# Altium footprint library XU-GENARAL PCB .PcbLib: 1176 footprints (part 51 of 75)
Each footprint in its own frame and in the unit in brackets; x right, y up, seen from the top. Pads: shape width x height; smd on the part's side, far side on the other; paste and mask are expansions set on the pad; w line width, h text height; cw(c..) or ccw(c..) is an arc to the next point about the centre after c.
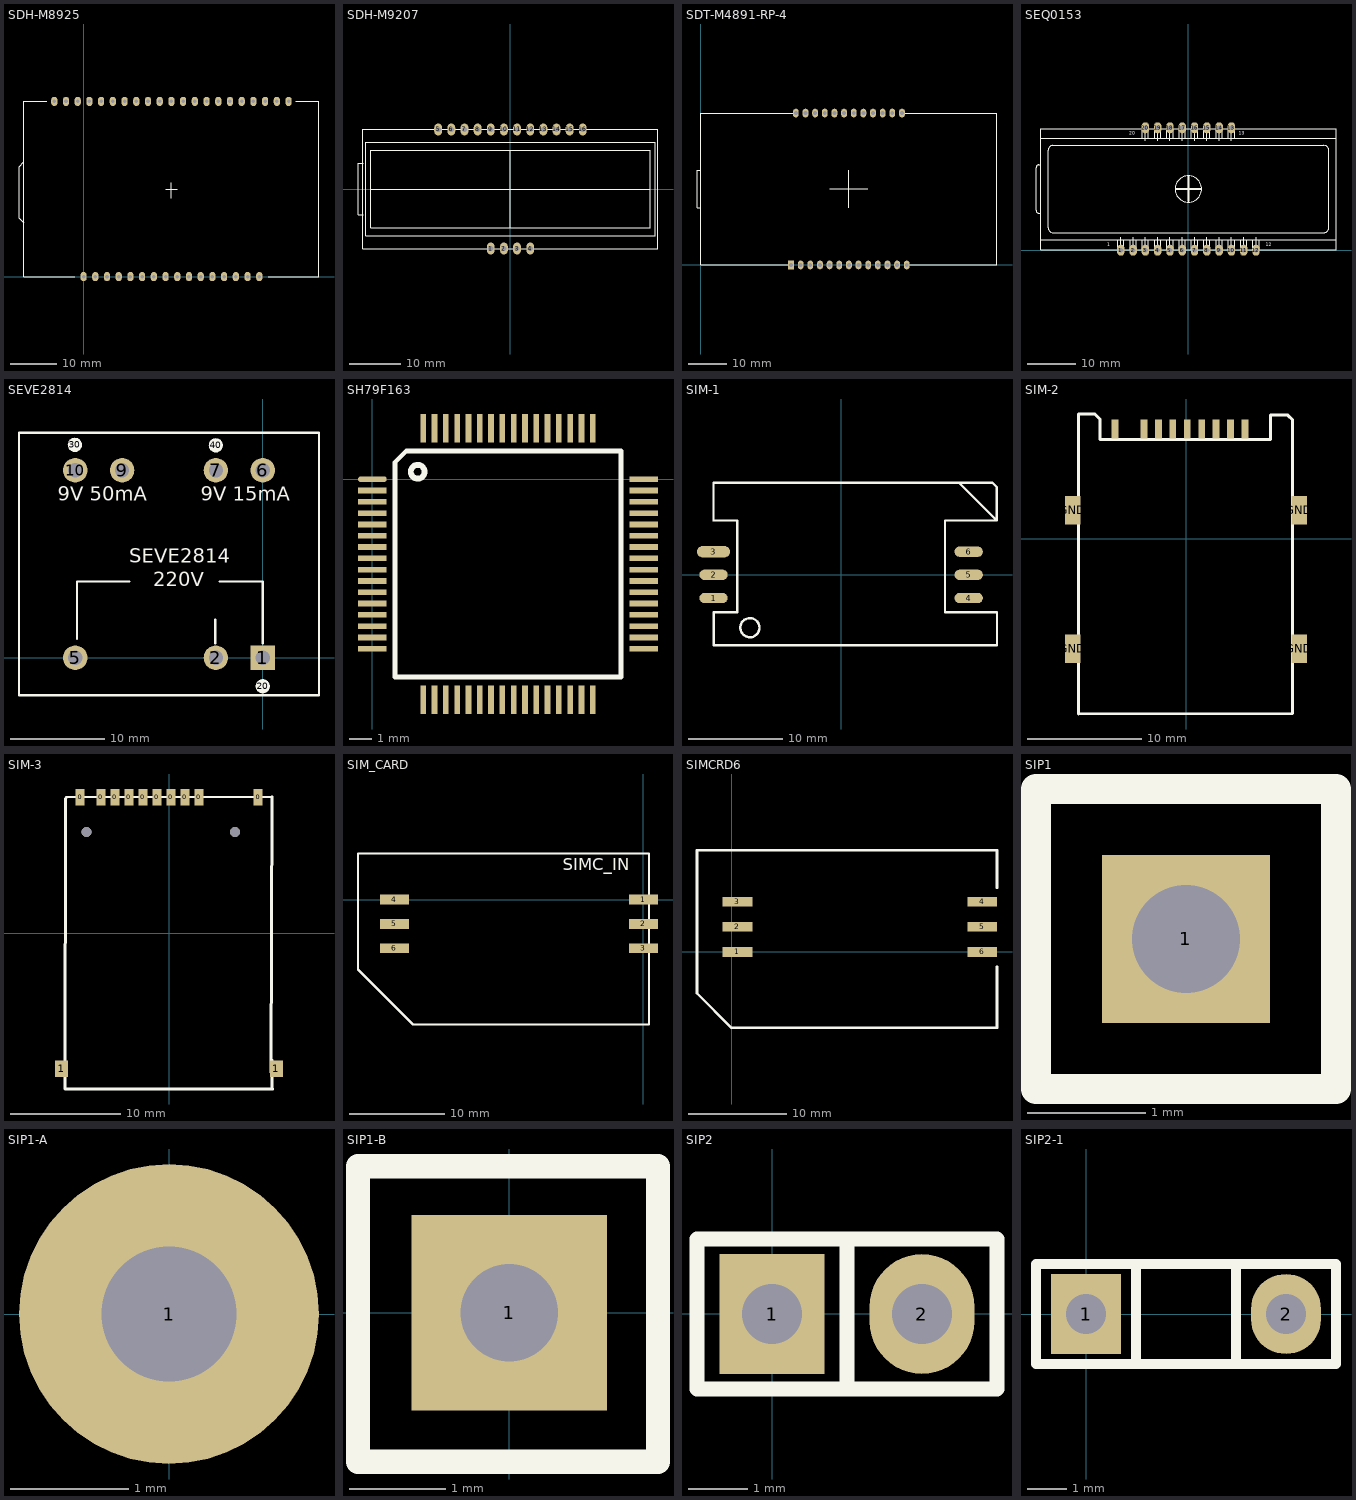
[diagram p50: the footprints below, top view; thin cyan lines are the x and y axes]

## SDH-M8925 [mm]
pads (37):
  oval 1.35x2 hole 0.762: 1(0,0) 2(2.54,0) 3(5.08,0) 4(7.62,0) 5(10.16,0) 6(12.7,0) 7(15.24,0) 8(17.78,0) 9(20.32,0) 10(22.86,0) 11(25.4,0) 12(27.94,0) 13(30.48,0) 14(33.02,0) 15(35.56,0) 16(38.1,0) 17(44.45,38) 18(41.91,38) 19(39.37,38) 20(36.83,38) 21(34.29,38) 22(31.75,38) 23(29.21,38) 24(26.67,38) 25(24.13,38) 26(21.59,38) 27(19.05,38) 28(16.51,38) 29(13.97,38) 30(11.43,38) 31(8.89,38) 32(6.35,38) 33(3.81,38) 34(1.27,38) 35(-1.27,38) 36(-3.81,38) 37(-6.35,38)
Top Overlay:
  lines w0.203: -13,11.7 -14,12.7 -14,23.876 -13,24.876 ; -7.95,38 -12.95,38 -12.95,0 -1.95,0 ; 17.78,19 20.32,19 ; 19.05,17.043 19.05,19 19.05,20.345 ; 40.05,0 51.05,0 51.05,38 46.05,38

## SDH-M9207 [mil]
pads (16):
  oval 60x90 hole 40: 1(-150,-452.76) 2(-50,-452.76) 3(50,-452.76) 4(150,-452.76) 5(-550,452.76) 6(-450,452.76) 7(-350,452.76) 8(-250,452.76) 9(-150,452.76) 10(-50,452.76) 11(50,452.76) 12(150,452.76) 13(250,452.76) 14(350,452.76) 15(450,452.76) 16(550,452.76)
Top Overlay:
  lines w5: -1120.63,-196.82 -1160,-196.82 -1160,196.88 -1120.63,196.88 ; -1062.99,0 1062.99,0 ; 0,-295.28 0,295.28 ; -1122.05,-452.76 -1122.05,452.76 1122.05,452.76 1122.05,-452.76 -1122.05,-452.76 ; -1102.36,-354.33 -1102.36,354.33 1102.36,354.33 1102.36,-354.33 -1102.36,-354.33 ; -1062.99,-295.28 1062.99,-295.28 1062.99,295.28 -1062.99,295.28 -1062.99,-295.28

## SDT-M4891-RP-4 [mil]
pads (25):
  rect 60x90 hole 40: 1(935.43,0)
  oval 60x90 hole 40: 2(1035.43,0) 3(1135.43,0) 4(1235.43,0) 5(1335.43,0) 6(1435.43,0) 7(1535.43,0) 8(1635.43,0) 9(1735.43,0) 10(1835.43,0) 11(1935.43,0) 12(2035.43,0) 13(2135.43,0) 14(2085.43,1574.8) 15(1985.43,1574.8) 16(1885.43,1574.8) 17(1785.43,1574.8) 18(1685.43,1574.8) 19(1585.43,1574.8) 20(1485.43,1574.8) 21(1385.43,1574.8) 22(1285.43,1574.8) 23(1185.43,1574.8) 24(1085.43,1574.8) 25(985.43,1574.8)
Top Overlay:
  lines w10: 0,590.55 -39.37,590.55 -39.37,984.25 0,984.25 ; 935.43,0 0,0 0,1574.8 985.43,1574.8 ; 1338.58,787.4 1732.28,787.4 ; 1535.43,590.55 1535.43,984.25 ; 2085.43,1574.8 3070.87,1574.8 3070.87,0 2135.43,0

## SEQ0153 [mil]
pads (20):
  oval 60x90 hole 40: 1(-550,0) 2(-450,0) 3(-350,0) 4(-250,0) 5(-150,0) 6(-50,0) 7(50,0) 8(150,0) 9(250,0) 10(350,0) 11(450,0) 12(550,0) 13(350,996.06) 14(250,996.06) 15(150,996.06) 16(50,996.06) 17(-50,996.06) 18(-150,996.06) 19(-250,996.06) 20(-350,996.06)
Top Overlay:
  circle w10: c0,498 r107.54
  lines w5: -1200.63,84.49 1200.94,84.49 ; -1200.63,301.02 -1216.38,301.02 cw(c-1216.38,324.65) -1240,324.65 -1240,671.1 cw(c-1216.38,671.1) -1216.38,694.72 -1200.63,694.72 ; -1200.63,911.26 1200.94,911.26 ; -574.84,5.75 -574.84,84.49 ; -549.84,-13.94 -549.84,104.17 ; -524.84,5.75 -524.84,84.49 ; -474.84,5.75 -474.84,84.49 ; -449.84,-13.94 -449.84,104.17 ; -424.84,5.75 -424.84,84.49 ; -374.84,5.75 -374.84,84.49 ; -374.84,911.26 -374.84,990 ; -349.84,-13.94 -349.84,104.17 ; -349.84,891.57 -349.84,1009.68 ; -324.84,5.75 -324.84,84.49 ; -324.84,911.26 -324.84,990 ; -274.84,5.75 -274.84,84.49 ; -274.84,911.26 -274.84,990 ; -249.84,-13.94 -249.84,104.17 ; -249.84,891.57 -249.84,1009.68 ; -224.84,5.75 -224.84,84.49 ; -224.84,911.26 -224.84,990 ; -174.84,5.75 -174.84,84.49 ; -174.84,911.26 -174.84,990 ; -149.84,-13.94 -149.84,104.17 ; -149.84,891.57 -149.84,1009.68 ; -124.84,5.75 -124.84,84.49 ; -124.84,911.26 -124.84,990 ; -74.84,5.75 -74.84,84.49 ; -74.84,911.26 -74.84,990 ; -49.84,-13.94 -49.84,104.17 ; -49.84,891.57 -49.84,1009.68 ; -24.84,5.75 -24.84,84.49 ; -24.84,911.26 -24.84,990 ; 25.16,5.75 25.16,84.49 ; 25.16,911.26 25.16,990 ; 50.16,-13.94 50.16,104.17 ; 50.16,891.57 50.16,1009.68 ; 75.16,5.75 75.16,84.49 ; 75.16,911.26 75.16,990 ; 125.16,5.75 125.16,84.49 ; 125.16,911.26 125.16,990 ; 150.16,-13.94 150.16,104.17 ; 150.16,891.57 150.16,1009.68 ; 175.16,5.75 175.16,84.49 ; 175.16,911.26 175.16,990 ; 225.16,5.75 225.16,84.49 ; 225.16,911.26 225.16,990 ; 250.16,-13.94 250.16,104.17 ; 250.16,891.57 250.16,1009.68 ; 275.16,5.75 275.16,84.49 ; 275.16,911.26 275.16,990 ; 325.16,5.75 325.16,84.49 ; 325.16,911.26 325.16,990 ; 350.16,-13.94 350.16,104.17 ; 350.16,891.57 350.16,1009.68 ; 375.16,5.75 375.16,84.49 ; 375.16,911.26 375.16,990 ; 425.16,5.75 425.16,84.49 ; 450.16,-13.94 450.16,104.17 ; 475.16,5.75 475.16,84.49 ; 525.16,5.75 525.16,84.49 ; 550.16,-13.94 550.16,104.17 ; 575.16,5.75 575.16,84.49 ; -1200.63,5.75 1200.94,5.75 1200.94,990 -1200.63,990 -1200.63,5.75 ; -1141.57,182.91 ccw(c-1102.2,182.91) -1102.2,143.54 1102.52,143.54 ccw(c1102.52,182.91) 1141.89,182.91 1141.89,812.83 ccw(c1102.52,812.83) 1102.52,852.2 -1102.2,852.2 ccw(c-1102.2,812.83) -1141.57,812.83 -1141.57,182.91
  lines w15: -100.97,498.03 13,498.03 ; 0,400 0,573 ; 0,574 0,603 ; 12,498.03 104.97,498.03
  text "13" at 408.95,937.51 h26.25
  text "20" at -482.19,937.51 h26.25
  text "12" at 628.29,31.99 h26.25
  text "1" at -661.38,31.99 h26.25

## SEVE2814 [mm]
pads (10):
  rect 2.6x2.6 hole 1.5: 1(0,0)
  round 2.6 hole 1.5: 2(-5,0) 5(-20,0) 6(0,20) 7(-5,20) 9(-15,20) 10(-20,20)
  round 1.524 on Top Overlay: 20(0,-3.048) 30(-20.041,22.708) 40(-5.004,22.657)
Top Overlay:
  lines w0.254: -19.812,2.032 -19.812,8.128 -14.224,8.128 ; -5.08,1.524 -5.08,4.064 ; -4.572,8.128 0,8.128 0,1.524 ; -26,-4 6,-4 6,24 -26,24 -26,-4
  text "9V 50mA" at -21.844,16.764 h1.52
  text "9V 15mA" at -6.604,16.764 h1.52
  text "SEVE2814" at -14.224,10.16 h1.52
  text "220V" at -11.684,7.62 h1.52

## SH79F163 [mm]
pads (64):
  oval 1.27x0.254 smd: 1(0,0)
  rect 1.27x0.254 smd: 2(0,-0.5) 3(0,-1) 4(0,-1.5) 5(0,-2) 6(0,-2.5) 7(0,-3) 8(0,-3.5) 9(0,-4) 10(0,-4.5) 11(0,-5) 12(0,-5.5) 13(0,-6) 14(0,-6.5) 15(0,-7) 16(0,-7.5) 33(12,-7.5) 34(12,-7) 35(12,-6.5) 36(12,-6) 37(12,-5.5) 38(12,-5) 39(12,-4.5) 40(12,-4) 41(12,-3.5) 42(12,-3) 43(12,-2.5) 44(12,-2) 45(12,-1.5) 46(12,-1) 47(12,-0.5) 48(12,0)
  rect 0.254x1.27 smd: 17(2.25,-9.75) 18(2.75,-9.75) 19(3.25,-9.75) 20(3.75,-9.75) 21(4.25,-9.75) 22(4.75,-9.75) 23(5.25,-9.75) 24(5.75,-9.75) 25(6.25,-9.75) 26(6.75,-9.75) 27(7.25,-9.75) 28(7.75,-9.75) 29(8.25,-9.75) 30(8.75,-9.75) 31(9.25,-9.75) 32(9.75,-9.75) 49(9.75,2.25) 50(9.25,2.25) 51(8.75,2.25) 52(8.25,2.25) 53(7.75,2.25) 54(7.25,2.25) 55(6.75,2.25) 56(6.25,2.25) 57(5.75,2.25) 58(5.25,2.25) 59(4.75,2.25) 60(4.25,2.25) 61(3.75,2.25) 62(3.25,2.25) 63(2.75,2.25) 64(2.25,2.25)
Top Overlay:
  circle w0.254: c2.006,0.33 r0.306
  lines w0.203: 1,-8.75 1,0.75 1.5,1.25 11,1.25 11,-8.75 1,-8.75

## SIM-1 [mm]
pads (6):
  oval 3x1.1 smd: 1(-13.5,-2.45) 2(-13.5,0) 4(13.5,-2.45) 5(13.5,0) 6(13.5,2.45)
  oval 3.5x1.2 smd: 3(-13.5,2.45)
Top Overlay:
  circle w0.254: c-9.652,-5.588 r1.016
  lines w0.254: -13.495,-7.43 -13.495,-3.95 -11,-3.95 -11,5.735 ; -13.475,-7.45 16.5,-7.45 ; -11,5.75 -13.492,5.75 -13.5,5.758 -13.5,9.75 16.011,9.75 16.467,9.294 16.467,5.75 ; 11,-3.95 11,5.75 16.467,5.75 ; 11.005,-3.95 14.923,-3.95 ; 12.467,9.75 16.467,5.75 ; 14.542,-3.95 16.495,-3.95 16.495,-7.445

## SIM-2 [mm]
pads (13):
  rect 0.6x1.65 smd: 0(-6.25,9.662) 0(-3.7,9.662) 0(-2.43,9.662) 0(-1.16,9.662) 0(0.11,9.662) 0(1.38,9.662) 0(2.65,9.662) 0(3.92,9.662) 0(5.19,9.662)
  rect 1.35x2.5 smd: GND(-9.95,-9.662) GND(-9.95,2.538) GND(9.95,-9.662) GND(9.95,2.537)
Top Overlay:
  lines w0.254: -9.44,-15.382 -9.44,10.983 -9.186,10.983 -8.018,10.983 -7.561,10.526 -7.561,8.748 7.425,8.748 7.425,10.882 8.949,10.882 9.356,10.475 9.356,-15.331 -9.44,-15.382

## SIM-3 [mm]
pads (12):
  rect 0.8x1.5 smd: 0(-8.07,12.325) 0(-6.17,12.325) 0(-4.9,12.325) 0(-3.63,12.325) 0(-2.36,12.325) 0(-1.09,12.325) 0(0.18,12.325) 0(1.45,12.325) 0(2.72,12.325) 0(8.08,12.325)
  rect 1.2x1.5 smd: 1(-9.75,-12.325) 1(9.75,-12.325)
via 6,9.175 diameter 0.9 hole 0.9
via -7.5,9.175 diameter 0.9 hole 0.9
Top Overlay:
  lines w0.254: 7.778,12.325 9.353,12.375 ; 9.251,-12.618 9.353,12.375 ; 9.353,-11.501 9.353,-14.091 9.404,-14.142 8.642,-14.142 -9.443,-14.142 -9.392,12.223 -9.291,12.325 9.353,12.375

## SIM_CARD [mil]
pads (6):
  rect 120x40 smd: 1(0,0) 2(0,-100) 3(0,-200) 4(-1023.62,0) 5(-1023.62,-100) 6(-1023.62,-200)
Top Overlay:
  lines w7.87: -1173.23,189.37 23.62,189.37 23.62,-513.39 -946.81,-513.39
  lines w10: -1173.23,189.37 -1173.23,-285 -1173.23,-286.97 -946.81,-513.39
  text "SIMC_IN" at -331.96,120.23 h50

## SIMCRD6 [mm]
pads (6):
  rect 3x1 smd: 1(0.6,0) 2(0.6,2.54) 3(0.6,5.08) 4(25.4,5.08) 5(25.4,2.54) 6(25.4,0)
Top Overlay:
  lines w0.254: 26.9,-1.5 26.9,-7.7 3,-7.7 0,-7.7 -3.5,-4.2 -3.5,10.3 26.9,10.3 26.9,6.5

## SIP1 [mil]
pads (1):
  rect 56x56 hole 36: 1(-1000,4000)
Top Overlay:
  lines w10: -1050,3950 -1050,4050 -950,4050 -950,3950 -1050,3950

## SIP1-A [mil]
pads (1):
  round 100 hole 45: 1(0,0)

## SIP1-B [mil]
pads (1):
  rect 80x80 hole 40: 1(0,0)
Top Overlay:
  lines w10: -62,60 -62,-61 61,-61 61,60 -60,60

## SIP2 [mil]
pads (2):
  rect 70x80 hole 40: 1(-0.04,-0.15)
  oval 70x80 hole 40: 2(99.96,-0.15)
Top Overlay:
  lines w10: 49.96,-50.15 49.96,49.85 ; -50.04,-50.15 149.96,-50.15 149.96,49.85 -50.04,49.85 -50.04,-50.15

## SIP2-1 [mil]
pads (2):
  rect 70x80 hole 40: 1(0,0)
  oval 70x80 hole 40: 2(200,0)
Top Overlay:
  lines w10: 50,-50 50,50 ; 150,-50 150,50 ; -50,-50 -50,50 250,50 250,-50 -50,-50